# Altium footprint library ICs And Semiconductors THD.PcbLib: 292 footprints (part 19 of 19)
Each footprint in its own frame and in the unit in brackets; x right, y up, seen from the top. Pads: shape width x height; smd on the part's side, far side on the other; paste and mask are expansions set on the pad; w line width, h text height; cw(c..) or ccw(c..) is an arc to the next point about the centre after c.
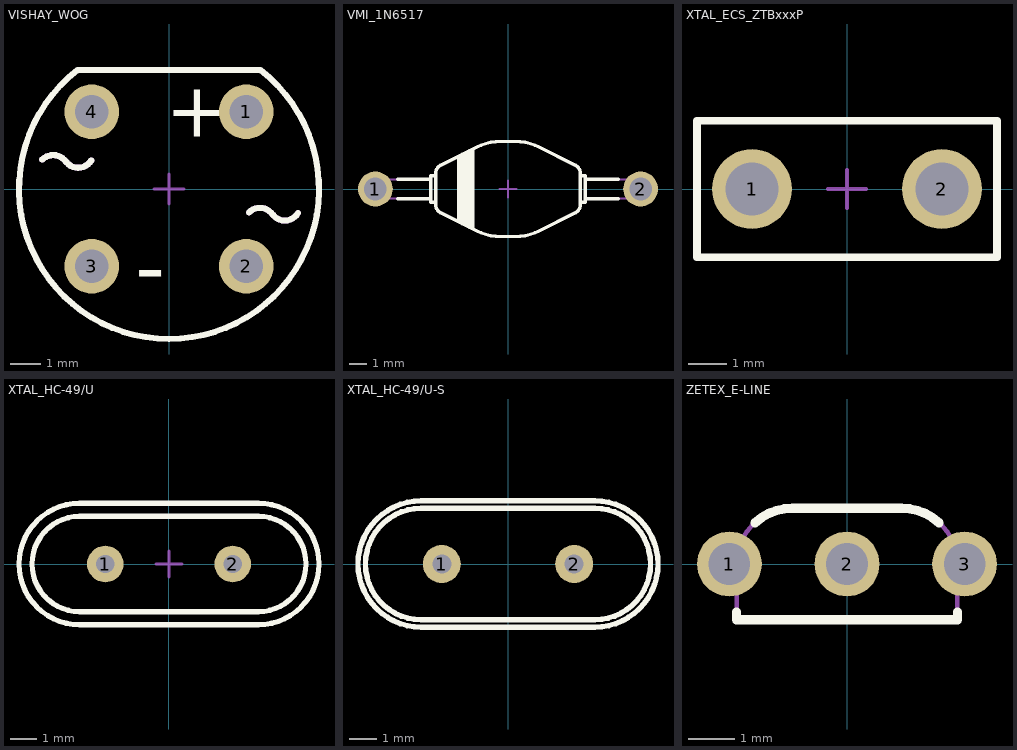
[diagram p18: the footprints below, top view; thin cyan lines are the x and y axes]

## VISHAY_WOG [mm] "Bridge Rectifier, Body 9.35m x 8.33mm, VISHAY Case Type WOG"
height 5.6
pads (4):
  round 1.8 hole 1.1: 1(2.54,2.54) 2(2.54,-2.54) 3(-2.54,-2.54) 4(-2.54,2.54)
Top Overlay:
  lines w0.2: -4.165,0.963 cw(c-3.805,0.616) -3.39,0.895 ; -3.365,0.875 ccw(c-2.984,1.198) -2.555,0.941 ; 2.625,-0.772 cw(c2.985,-1.119) 3.4,-0.84 ; 3.425,-0.86 ccw(c3.806,-0.537) 4.235,-0.794 ; -3.003,3.91 ccw(c0,0) 3.003,3.91 -3.003,3.91
  text "+" at -0.1,1.72 h1.8
  text "-" at -1.105,-3.52 h2
Notvisible:
  lines w0.1: -3.04,-2.54 -2.54,-2.54 ; -3.04,2.54 -2.54,2.54 ; -2.54,-3.04 -2.54,-2.54 ; -2.54,-2.04 -2.54,-2.54 ; -2.54,2.04 -2.54,2.54 ; -2.54,3.04 -2.54,2.54 ; -2.04,-2.54 -2.54,-2.54 ; -2.04,2.54 -2.54,2.54 ; -0.5,0 0,0 ; 0,-0.5 0,0 ; 0,0.5 0,0 ; 0.5,0 0,0 ; 2.04,-2.54 2.54,-2.54 ; 2.04,2.54 2.54,2.54 ; 2.54,-3.04 2.54,-2.54 ; 2.54,-2.04 2.54,-2.54 ; 2.54,2.04 2.54,2.54 ; 2.54,3.04 2.54,2.54 ; 3.04,-2.54 2.54,-2.54 ; 3.04,2.54 2.54,2.54
Mechanical 14:
  lines w0.1: -3.003,3.91 ccw(c0,0) 3.003,3.91 -3.003,3.91
  lines w0.2: -4.165,0.963 cw(c-3.805,0.616) -3.39,0.895 ; -3.365,0.875 ccw(c-2.984,1.198) -2.555,0.941 ; 2.625,-0.772 cw(c2.985,-1.119) 3.4,-0.84 ; 3.425,-0.86 ccw(c3.806,-0.537) 4.235,-0.794
  text "+" at -0.1,1.72 h1.8
  text "-" at -1.105,-3.52 h2
3D body "VISHAY_WOG.stp": height 8.6, standoff -3.6, extent -4.888,-4.888 4.888,3.91

## VMI_1N6517 [mm] "DO-201AD, Diode, Axial; Lead Spacing 15.24mm, Lead Dia. 1mm, Body Length 8.89mm, Body Dia. 5.46mm"
height 5.46
pads (2):
  round 2 hole 1.3: 1(-7.62,0) 2(7.62,0)
Top Overlay:
  lines w0.2: -6.333,-0.55 -4.445,-0.55 ; -6.333,0.55 -4.445,0.55 ; -4.145,-0.75 -4.445,-0.75 -4.445,0.75 -4.145,0.75 ; -2.824,-1.891 -2.824,1.891 ; -2.624,-1.991 -2.624,1.991 ; -2.424,-2.091 -2.424,2.091 ; -2.224,-2.191 -2.224,2.191 ; -2.024,-2.291 -2.024,2.291 ; 4.145,-0.75 4.445,-0.75 4.445,0.75 4.145,0.75 ; 4.445,-0.55 6.333,-0.55 ; 4.445,0.55 6.333,0.55 ; -4.145,-0.921 ccw(c-3.645,-0.921) -3.869,-1.368 -1.778,-2.413 ccw(c-0.437,0.27) -0.437,-2.73 0.437,-2.73 ccw(c0.437,0.27) 1.778,-2.413 3.869,-1.368 ccw(c3.645,-0.921) 4.145,-0.921 4.145,0.921 ccw(c3.645,0.921) 3.869,1.368 1.778,2.413 ccw(c0.437,-0.27) 0.437,2.73 -0.437,2.73 ccw(c-0.437,-0.27) -1.778,2.413 -3.869,1.368 ccw(c-3.645,0.921) -4.145,0.921 -4.145,-0.921
Notvisible:
  lines w0.1: -8.12,0 -7.62,0 ; -7.62,-0.5 -7.62,0 ; -7.62,0.5 -7.62,0 ; -7.12,0 -7.62,0 ; -0.5,0 0,0 ; 0,-0.5 0,0 ; 0,0.5 0,0 ; 0.5,0 0,0 ; 7.12,0 7.62,0 ; 7.62,-0.5 7.62,0 ; 7.62,0.5 7.62,0 ; 8.12,0 7.62,0
Mechanical 14:
  lines w0.1: -4.445,-0.55 -7.62,-0.55 cw(c-7.62,0) -7.62,0.55 -4.445,0.55 ; -4.145,-0.75 -4.445,-0.75 -4.445,0.75 -4.145,0.75 ; -2.824,-1.891 -2.824,1.891 ; -2.624,-1.991 -2.624,1.991 ; -2.424,-2.091 -2.424,2.091 ; -2.224,-2.191 -2.224,2.191 ; -2.024,-2.291 -2.024,2.291 ; 4.145,-0.75 4.445,-0.75 4.445,0.75 4.145,0.75 ; 4.445,-0.55 7.62,-0.55 ccw(c7.62,0) 7.62,0.55 4.445,0.55 ; -4.145,-0.921 ccw(c-3.645,-0.921) -3.869,-1.368 -1.778,-2.413 ccw(c-0.437,0.27) -0.437,-2.73 0.437,-2.73 ccw(c0.437,0.27) 1.778,-2.413 3.869,-1.368 ccw(c3.645,-0.921) 4.145,-0.921 4.145,0.921 ccw(c3.645,0.921) 3.869,1.368 1.778,2.413 ccw(c0.437,-0.27) 0.437,2.73 -0.437,2.73 ccw(c-0.437,-0.27) -1.778,2.413 -3.869,1.368 ccw(c-3.645,0.921) -4.145,0.921 -4.145,-0.921
3D body "VMI_1N6517.stp": height 5.46, standoff -3.6, extent -8.17,-2.73 8.17,2.73

## XTAL_ECS_ZTBxxxP [mm] "ZTB Serie Leaded Ceramic Resonator, Body L 7.9 x W 3.6mm H 9.3, Pitch 5mm"
height 9.3
pads (2):
  round 2.1 hole 1.4: 1(-2.5,0) 2(2.5,0)
Top Overlay:
  lines w0.2: -3.95,-1.8 3.95,-1.8 3.95,1.8 -3.95,1.8 -3.95,-1.8
Notvisible:
  lines w0.1: -3,0 -2.5,0 ; -2.5,-0.5 -2.5,0 ; -2.5,0.5 -2.5,0 ; -2,0 -2.5,0 ; -0.5,0 0,0 ; 0,-0.5 0,0 ; 0,0.5 0,0 ; 0.5,0 0,0 ; 2,0 2.5,0 ; 2.5,-0.5 2.5,0 ; 2.5,0.5 2.5,0 ; 3,0 2.5,0
Mechanical 14:
  lines w0.1: -3.95,-1.8 -3.95,1.8 3.95,1.8 3.95,-1.8 -3.95,-1.8
3D body "XTAL_ECS_ZTBxxxP.stp": height 9.3, standoff -3.6, extent -3.95,-1.8 3.95,1.8

## XTAL_HC-49/U [mm] "HC-49/U Leaded Cristal, Body 11.05x4.8mm; Pitch 4.88mm"
height 13.6
pads (2):
  round 1.4 hole 0.7: 1(-2.44,0) 2(2.44,0)
Top Overlay:
  lines w0.2: -5.75,0 cw(c-3.42,0) -3.42,2.33 3.42,2.33 cw(c3.42,0) 5.75,0 cw(c3.42,0) 3.42,-2.33 -3.42,-2.33 cw(c-3.42,0) -5.75,0 ; -5.25,0 cw(c-3.42,0) -3.42,1.83 3.42,1.83 cw(c3.42,0) 5.25,0 cw(c3.42,0) 3.42,-1.83 -3.42,-1.83 cw(c-3.42,0) -5.25,0
Notvisible:
  lines w0.1: -2.94,0 -2.44,0 ; -2.44,-0.5 -2.44,0 ; -2.44,0.5 -2.44,0 ; -1.94,0 -2.44,0 ; -0.5,0 0,0 ; 0,-0.5 0,0 ; 0,0.5 0,0 ; 0.5,0 0,0 ; 1.94,0 2.44,0 ; 2.44,-0.5 2.44,0 ; 2.44,0.5 2.44,0 ; 2.94,0 2.44,0
Mechanical 14:
  lines w0.1: -5.75,0 cw(c-3.42,0) -3.42,2.33 3.42,2.33 cw(c3.42,0) 5.75,0 cw(c3.42,0) 3.42,-2.33 -3.42,-2.33 cw(c-3.42,0) -5.75,0 ; -5.25,0 cw(c-3.42,0) -3.42,1.83 3.42,1.83 cw(c3.42,0) 5.25,0 cw(c3.42,0) 3.42,-1.83 -3.42,-1.83 cw(c-3.42,0) -5.25,0
3D body "XTAL_CITIZEN_HC-49-U-S.stp": height 3.5, standoff -3.6, extent -5.75,-2.33 5.75,2.33

## XTAL_HC-49/U-S [mm] "HC-49/U-S Leaded Cristal, Body 11.5x4.66mm; Pitch 4.88mm"
height 3.5
pads (2):
  round 1.4 hole 0.7: 1(-2.44,0) 2(2.44,0)
Top Overlay:
  lines w0.2: -3.2,-2.325 cw(c-3.2,0) -3.2,2.325 3.2,2.325 cw(c3.2,0) 3.2,-2.325 -3.2,-2.325 ; -3.2,-2.05 cw(c-3.2,0) -3.2,2.05 3.2,2.05 cw(c3.2,0) 3.2,-2.05 -3.2,-2.05
Mechanical 14:
  lines w0.1: -3.2,-2.325 cw(c-3.2,0) -3.2,2.325 3.2,2.325 cw(c3.2,0) 3.2,-2.325 -3.2,-2.325 ; -3.2,-2.05 cw(c-3.2,0) -3.2,2.05 3.2,2.05 cw(c3.2,0) 3.2,-2.05 -3.2,-2.05
3D body "XTAL_HC-49-U.stp": height 13.6, standoff -3.6, extent -5.525,-2.4 5.525,2.4

## ZETEX_E-LINE [mm] "E-Line Case, Pitch 2.54mm, Flat Index, 3 In-Line, Bent Leads, Body 4.57mm x 2.28mm"
height 8.78
pads (3):
  round 1.4 hole 0.9: 1(-2.54,0) 2(0,0) 3(2.54,0)
Top Overlay:
  lines w0.2: -2.385,-1.038 -2.385,-1.205 2.385,-1.205 2.385,-1.038 ; -1.989,0.894 cw(c-1.18,0) -1.18,1.205 1.18,1.205 cw(c1.18,0) 1.989,0.894
Notvisible:
  lines w0.1: -3.04,0 -2.54,0 ; -2.54,-0.5 -2.54,0 ; -2.54,0.5 -2.54,0 ; -2.04,0 -2.54,0 ; -0.5,0 0,0 ; 0,-0.5 0,0 ; 0,0.5 0,0 ; 0.5,0 0,0 ; 2.04,0 2.54,0 ; 2.54,-0.5 2.54,0 ; 2.54,0.5 2.54,0 ; 3.04,0 2.54,0
Mechanical 14:
  lines w0.1: -2.385,-0.225 -2.765,-0.225 -2.765,0.225 -2.364,0.225 ; 2.364,0.225 2.765,0.225 2.765,-0.225 2.385,-0.225 ; -2.385,-1.205 2.385,-1.205 2.385,0 ccw(c1.18,0) 1.18,1.205 -1.18,1.205 ccw(c-1.18,0) -2.385,0 -2.385,-1.205
3D body "ZETEX_E-LINE.stp": height 8.01, standoff -3.2, extent -2.765,-1.205 2.765,1.205